# Altium footprint library Airscout_PCB_LibV2.0.PcbLib: 50 footprints (part 3 of 4)
Each footprint in its own frame and in the unit in brackets; x right, y up, seen from the top. Pads: shape width x height; smd on the part's side, far side on the other; paste and mask are expansions set on the pad; w line width, h text height; cw(c..) or ccw(c..) is an arc to the next point about the centre after c.
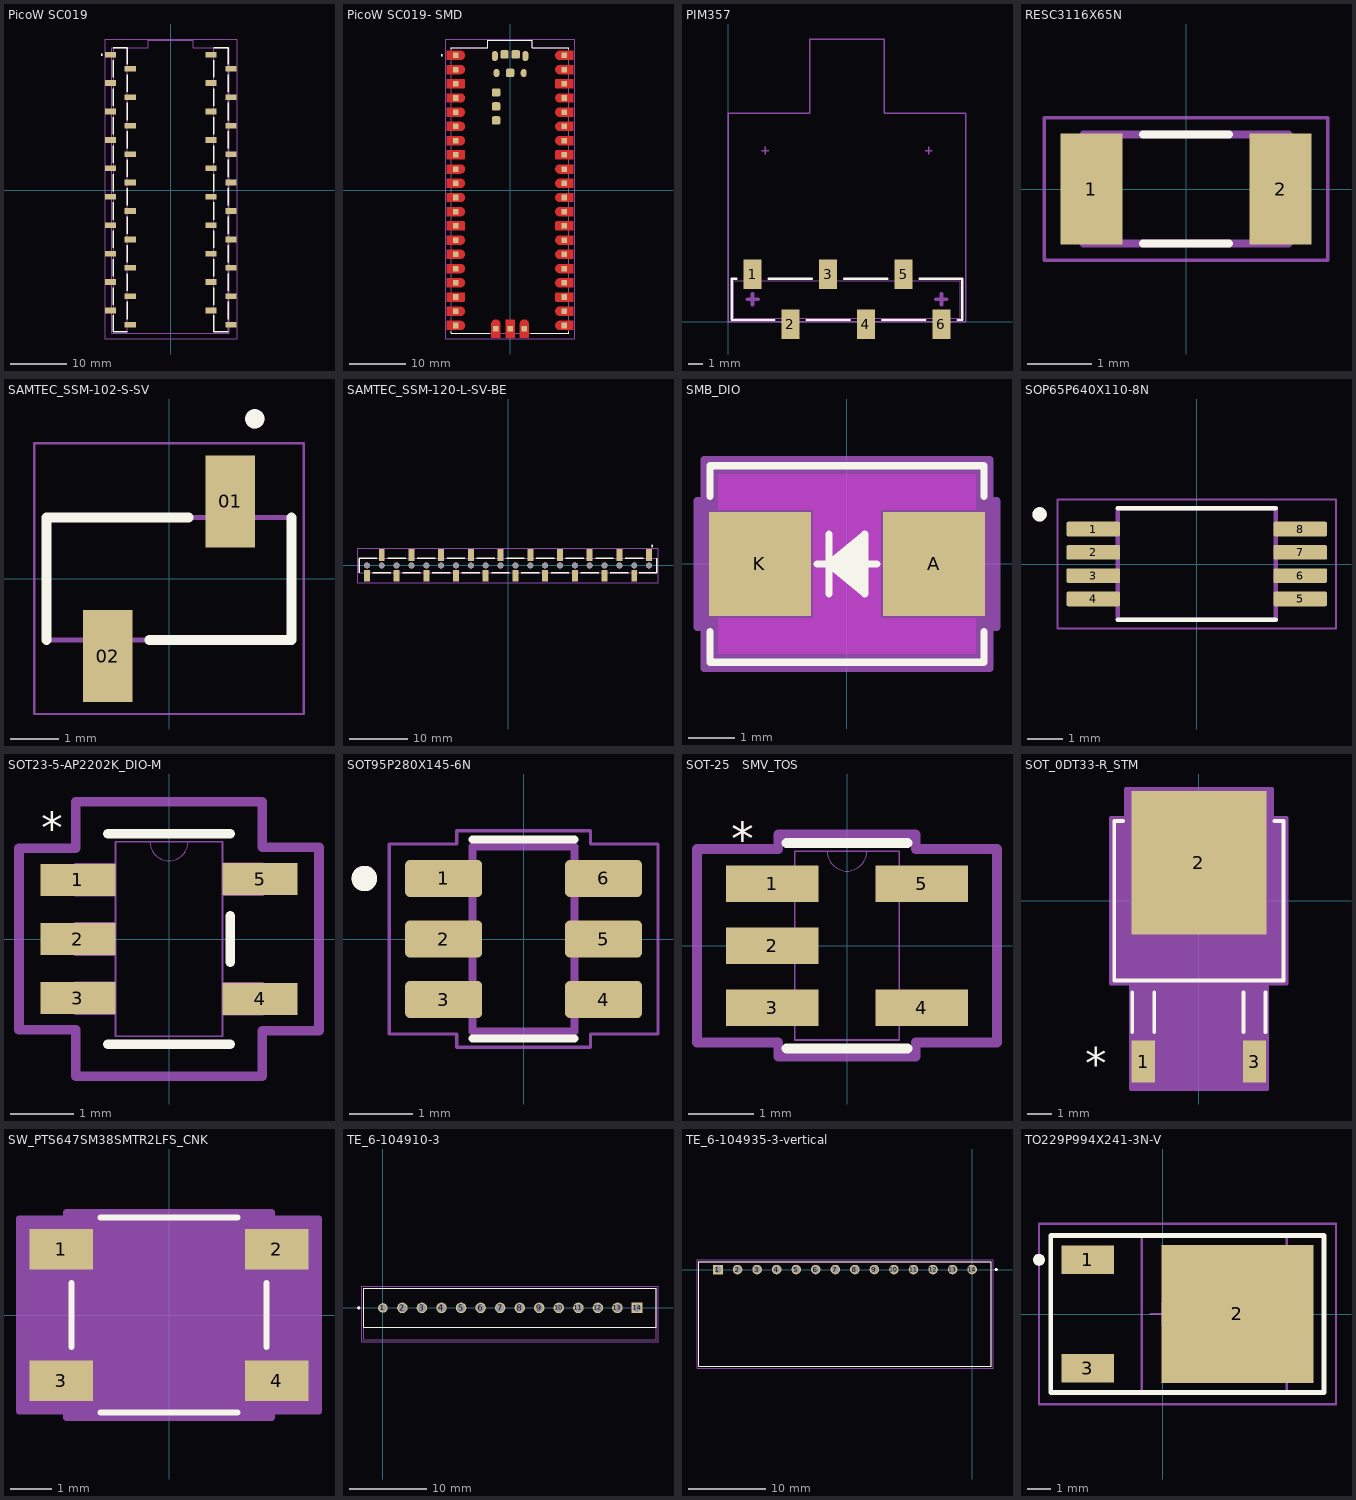
[diagram p2: the footprints below, top view; thin cyan lines are the x and y axes]

## PicoW SC019 [mm] "For Description look into Schematics"
pads (40):
  rect 2x1.02 smd: 1(-10.778,24.26) 2(-7.222,21.72) 3(-10.778,19.18) 4(-7.222,16.64) 5(-10.778,14.1) 6(-7.222,11.56) 7(-10.778,9.02) 8(-7.222,6.48) 9(-10.778,3.94) 10(-7.222,1.4) 11(-10.778,-1.14) 12(-7.222,-3.68) 13(-10.778,-6.22) 14(-7.222,-8.76) 15(-10.778,-11.3) 16(-7.222,-13.84) 17(-10.778,-16.38) 18(-7.222,-18.92) 19(-10.778,-21.46) 20(-7.222,-24) 21(10.778,-24) 22(7.222,-21.46) 23(10.778,-18.92) 24(7.222,-16.38) 25(10.778,-13.84) 26(7.222,-11.3) 27(10.778,-8.76) 28(7.222,-6.22) 29(10.778,-3.68) 30(7.222,-1.14) 31(10.778,1.4) 32(7.222,3.94) 33(10.778,6.48) 34(7.222,9.02) 35(10.778,11.56) 36(7.222,14.1) 37(10.778,16.64) 38(7.222,19.18) 39(10.778,21.72) 40(7.222,24.26)
Top Overlay:
  circle w0.2: c-12.3,24.26 r0.1
  lines w0.254: -10.27,-22.32 -10.27,-25.27 -7.73,-25.27 ; -10.27,-20.444 -10.27,-17.396 ; -10.27,-15.364 -10.27,-12.316 ; -10.27,-10.284 -10.27,-7.236 ; -10.27,-5.204 -10.27,-2.156 ; -10.27,-0.124 -10.27,2.924 ; -10.27,4.956 -10.27,8.004 ; -10.27,10.036 -10.27,13.084 ; -10.27,15.116 -10.27,18.164 ; -10.27,20.196 -10.27,23.244 ; -10.27,25.53 -7.73,25.53 -7.73,22.58 ; -7.73,-22.984 -7.73,-19.936 ; -7.73,-17.904 -7.73,-14.856 ; -7.73,-12.824 -7.73,-9.776 ; -7.73,-7.744 -7.73,-4.696 ; -7.73,-2.664 -7.73,0.384 ; -7.73,2.416 -7.73,5.464 ; -7.73,7.496 -7.73,10.544 ; -7.73,12.576 -7.73,15.624 ; -7.73,17.656 -7.73,20.704 ; 7.73,-22.32 7.73,-25.27 10.27,-25.27 ; 7.73,-20.444 7.73,-17.396 ; 7.73,-15.364 7.73,-12.316 ; 7.73,-10.284 7.73,-7.236 ; 7.73,-5.204 7.73,-2.156 ; 7.73,-0.124 7.73,2.924 ; 7.73,4.956 7.73,8.004 ; 7.73,10.036 7.73,13.084 ; 7.73,15.116 7.73,18.164 ; 7.73,20.196 7.73,23.244 ; 7.73,25.53 10.27,25.53 10.27,22.58 ; 10.27,-22.984 10.27,-19.936 ; 10.27,-17.904 10.27,-14.856 ; 10.27,-12.824 10.27,-9.776 ; 10.27,-7.744 10.27,-4.696 ; 10.27,-2.664 10.27,0.384 ; 10.27,2.416 10.27,5.464 ; 10.27,7.496 10.27,10.544 ; 10.27,12.576 10.27,15.624 ; 10.27,17.656 10.27,20.704
Mechanical 13:
  circle w0.2: c-12.3,24.26 r0.1
  lines w0.1: -10.27,-25.27 -10.27,25.53 ; -7.73,-25.27 -7.73,25.53 ; 7.73,-25.27 7.73,25.53 ; 10.27,-25.27 10.27,25.53
  lines w0.127: -10.5,-25.5 -10.5,25.5 -4,25.5 -4,26.8 4,26.8 4,25.5 10.5,25.5 10.5,-25.5 -10.5,-25.5
Mechanical 15:
  lines w0.05: -11.8,-26.55 -11.8,27.05 11.8,27.05 11.8,-26.55 -11.8,-26.55
3D body "SSM-120-L-SV-BE-K-TR.stp": height 7.52, standoff -0.1, extent 6.587,-25.27 11.159,25.53
3D body "SSM-120-L-SV-BE-K-TR.stp": height 7.52, standoff -0.1, extent -11.413,-25.27 -6.841,25.53
3D body "step_temp.STEP": height 11.23, standoff 7.5, extent -10.5,-25.5 10.5,26.8

## PicoW SC019- SMD [mm] "For Description look into Schematics"
pads (53):
  rect 1x1 smd paste-1 mask+0: 1(-9.69,24.13) 2(-9.69,21.59) 3(-9.69,19.05) 4(-9.69,16.51) 5(-9.69,13.97) 6(-9.69,11.43) 7(-9.69,8.89) 8(-9.69,6.35) 9(-9.69,3.81) 10(-9.69,1.27) 11(-9.69,-1.27) 12(-9.69,-3.81) 13(-9.69,-6.35) 14(-9.69,-8.89) 15(-9.69,-11.43) 16(-9.69,-13.97) 17(-9.69,-16.51) 18(-9.69,-19.05) 19(-9.69,-21.59) 20(-9.69,-24.13) 21(9.69,-24.13) 22(9.69,-21.59) 23(9.69,-19.05) 24(9.69,-16.51) 25(9.69,-13.97) 26(9.69,-11.43) 27(9.69,-8.89) 28(9.69,-6.35) 29(9.69,-3.81) 30(9.69,-1.27) 31(9.69,1.27) 32(9.69,3.81) 33(9.69,6.35) 34(9.69,8.89) 35(9.69,11.43) 36(9.69,13.97) 37(9.69,16.51) 38(9.69,19.05) 39(9.69,21.59) 40(9.69,24.13) D1(-2.54,-24.7) D2(0,-24.7) D3(2.54,-24.7)
  oval 1.1x1.8 smd: A(-2.725,24) B(2.725,24)
  oval 1.05x1.45 smd: C(-2.425,20.97) D(2.425,20.97)
  rrect40% 1.5x1.5 smd: TP1(0,21) TP2(1,24.3) TP3(-1,24.3) TP4(-2.5,17.5) TP5(-2.5,15) TP6(-2.5,12.5)
Top Layer:
  drawing of 43 lines, arcs and shapes, not listed
Top Overlay:
  circle w0.2: c-12.19,24.13 r0.1
  lines w0.127: -10.5,-25.25 -10.5,-25.5 -3.66,-25.5 ; -10.5,25.25 -10.5,25.5 -4,25.5 -4,26.8 4,26.8 4,25.5 10.5,25.5 10.5,25.25 ; 3.66,-25.5 10.5,-25.5 10.5,-25.25
Top Paste:
  drawing of 43 lines, arcs and shapes, not listed
Top Solder:
  drawing of 43 lines, arcs and shapes, not listed
Mechanical 13:
  circle w0.2: c-12.19,24.13 r0.1
  lines w0.127: -10.5,-25.5 -10.5,25.5 -4,25.5 -4,26.8 4,26.8 4,25.5 10.5,25.5 10.5,-25.5 -10.5,-25.5
Mechanical 15:
  lines w0.05: -11.54,-26.55 -11.54,27.05 11.54,27.05 11.54,-26.55 -11.54,-26.55
3D body "step_temp.STEP": height 6.27, standoff 2.54, extent -10.5,-25.5 10.5,26.8

## PIM357 [mm] "With BME680 Sensor"
pads (6):
  rect 1.2x2 smd paste+0 mask+0.025: 1(1.65,3.176) 2(4.19,-0.176) 3(6.73,3.176) 4(9.27,-0.176) 5(11.81,3.176) 6(14.35,-0.176)
Top Overlay:
  lines w0.152: 0.568,2.872 0.253,2.872 0.253,0.103 3.108,0.103 ; 2.732,2.872 5.648,2.872 ; 5.272,0.103 8.188,0.103 ; 7.812,2.872 10.728,2.872 ; 10.352,0.103 13.268,0.103 ; 12.892,2.872 15.747,2.872 15.747,0.103 15.432,0.103
Mechanical 7:
  lines w0.254: 1.285,1.5 2.015,1.5 ; 1.65,1.135 1.65,1.865 ; 13.985,1.5 14.715,1.5 ; 14.35,1.135 14.35,1.865
Mechanical 13:
  lines w0.025: 0.38,0.23 0.38,2.745 15.62,2.745 15.62,0.23 0.38,0.23
  lines w0.1: 0,1.5 0,0 ; 2.25,11.5 2.75,11.5 ; 2.5,11.25 2.5,11.75 ; 13.25,11.5 13.75,11.5 ; 13.5,11.25 13.5,11.75 ; 16,11.5 16,14 ; 0,0 16,0 16,14 ; 0,0 0,14 5.5,14 5.5,19 10.5,19 10.5,14 16,14
3D body "NPPC061KFXC-RC--3DModel-STEP-740413.STEP": height 7.49, standoff 0, extent 0.381,-0.749 15.621,3.543

## RESC3116X65N [mm] "Caseform: 1206 Imperial"
pads (2):
  rect 0.97x1.73 smd: 1(-1.48,0) 2(1.48,0)
Top Overlay:
  lines w0.127: -0.67,-0.85 0.67,-0.85 ; -0.67,0.85 0.67,0.85
Mechanical 13:
  lines w0.127: -1.6,-0.85 1.6,-0.85 1.6,0.85 -1.6,0.85 -1.6,-0.85
Mechanical 15:
  lines w0.05: -2.215,-1.115 2.215,-1.115 2.215,1.115 -2.215,1.115 -2.215,-1.115
3D body "step_temp.STEP": height 0.65, standoff 0, extent -1.55,-0.8 1.55,0.8

## SAMTEC_SSM-102-S-SV [mm]
pads (2):
  rect 1.02x1.905 smd: 01(1.27,1.603) 02(-1.27,-1.603)
Top Overlay:
  circle w0.2: c1.78,3.315 r0.1
  lines w0.2: -2.54,-1.27 -2.54,1.27 0.41,1.27 ; -0.41,-1.27 2.54,-1.27 2.54,1.27
Mechanical 13:
  circle w0.2: c1.78,3.315 r0.1
  lines w0.1: -2.54,-1.27 -2.54,1.27 2.54,1.27 2.54,-1.27 -2.54,-1.27
Mechanical 15:
  lines w0.05: -2.79,-2.805 -2.79,2.805 2.79,2.805 2.79,-2.805 -2.79,-2.805
3D body "SSM-102-S-SV.stp": height 7.37, standoff -0.13, extent -2.54,-2.286 2.54,2.286

## SAMTEC_SSM-120-L-SV-BE [mm]
pads (40):
  rect 1.02x2 smd: 01(24.13,1.778) 02(21.59,-1.778) 03(19.05,1.778) 04(16.51,-1.778) 05(13.97,1.778) 06(11.43,-1.778) 07(8.89,1.778) 08(6.35,-1.778) 09(3.81,1.778) 10(1.27,-1.778) 11(-1.27,1.778) 12(-3.81,-1.778) 13(-6.35,1.778) 14(-8.89,-1.778) 15(-11.43,1.778) 16(-13.97,-1.778) 17(-16.51,1.778) 18(-19.05,-1.778) 19(-21.59,1.778) 20(-24.13,-1.778)
  round 1.02 hole 1.02 unplated: ""(-24.13,0) ""(-21.59,0) ""(-19.05,0) ""(-16.51,0) ""(-13.97,0) ""(-11.43,0) ""(-8.89,0) ""(-6.35,0) ""(-3.81,0) ""(-1.27,0) ""(1.27,0) ""(3.81,0) ""(6.35,0) ""(8.89,0) ""(11.43,0) ""(13.97,0) ""(16.51,0) ""(19.05,0) ""(21.59,0) ""(24.13,0)
Top Overlay:
  circle w0.2: c24.64,3.315 r0.1
  lines w0.254: -25.4,-1.27 -25.4,1.27 -22.45,1.27 ; -23.114,-1.27 -20.066,-1.27 ; -20.574,1.27 -17.526,1.27 ; -18.034,-1.27 -14.986,-1.27 ; -15.494,1.27 -12.446,1.27 ; -12.954,-1.27 -9.906,-1.27 ; -10.414,1.27 -7.366,1.27 ; -7.874,-1.27 -4.826,-1.27 ; -5.334,1.27 -2.286,1.27 ; -2.794,-1.27 0.254,-1.27 ; -0.254,1.27 2.794,1.27 ; 2.286,-1.27 5.334,-1.27 ; 4.826,1.27 7.874,1.27 ; 7.366,-1.27 10.414,-1.27 ; 9.906,1.27 12.954,1.27 ; 12.446,-1.27 15.494,-1.27 ; 14.986,1.27 18.034,1.27 ; 17.526,-1.27 20.574,-1.27 ; 20.066,1.27 23.114,1.27 ; 22.45,-1.27 25.4,-1.27 25.4,1.27
Mechanical 13:
  circle w0.2: c24.64,3.315 r0.1
  lines w0.1: -25.4,-1.27 25.4,-1.27 25.4,1.27 -25.4,1.27 -25.4,-1.27
Mechanical 15:
  lines w0.05: -25.65,-2.921 25.65,-2.921 25.65,2.921 -25.65,2.921 -25.65,-2.921
3D body "SSM-120-L-SV-BE-K-TR.stp": height 7.52, standoff -0.1, extent -25.4,-2.413 25.4,2.159

## SMB_DIO [mm]
pads (2):
  rect 2.18x2.21 smd paste+0 mask+0: A(1.857,0) K(-1.857,0)
Top Layer keep-out:
  region: -2.744,-1.919 -2.744,-1.156 2.744,-1.156 2.744,-1.919
  region: -2.744,1.156 -2.744,1.919 2.744,1.919 2.744,1.156
  region: -0.716,-1.156 -0.716,1.156 0.716,1.156 0.716,-1.156
Top Overlay:
  lines w0.152: -2.922,-1.438 -2.922,-2.097 2.922,-2.097 2.922,-1.438 ; -2.922,1.438 -2.922,2.097 2.922,2.097 2.922,1.438 ; -0.636,0 0.634,0 ; -0.382,-0.635 -0.382,0.635 ; 0.38,-0.508 -0.382,0 ; 0.38,-0.381 -0.382,0 ; 0.38,-0.254 -0.382,0 ; 0.38,-0.127 -0.382,0 ; 0.38,0.127 -0.382,0 ; 0.38,0.254 -0.382,0 ; 0.38,0.381 -0.382,0 ; 0.38,0.508 -0.382,0 ; -0.382,0 0.38,0.635 0.38,-0.635 -0.382,0
Mechanical 13:
  lines w0.025: -0.636,0 0.634,0 ; -0.382,-0.635 -0.382,0.635 ; 0.38,-0.508 -0.382,0 ; 0.38,-0.381 -0.382,0 ; 0.38,-0.254 -0.382,0 ; 0.38,-0.127 -0.382,0 ; 0.38,0.127 -0.382,0 ; 0.38,0.254 -0.382,0 ; 0.38,0.381 -0.382,0 ; 0.38,0.508 -0.382,0 ; -0.382,0 0.38,0.635 0.38,-0.635 -0.382,0 ; -2.795,-1.97 -2.795,1.97 2.795,1.97 2.795,-1.97 -2.795,-1.97
Mechanical 15:
  region: -3.049,-1.359 -3.201,-1.359 -3.201,1.359 -3.049,1.359 -3.049,2.224 3.049,2.224 3.049,1.359 3.201,1.359 3.201,-1.359 3.049,-1.359 3.049,-2.224 -3.049,-2.224
  lines w0.152: -3.201,-1.359 -3.049,-1.359 -3.049,-2.224 3.049,-2.224 3.049,-1.359 3.201,-1.359 3.201,1.359 3.049,1.359 3.049,2.224 -3.049,2.224 -3.049,1.359 -3.201,1.359 -3.201,-1.359
3D body "SMB_DIO.step": height 2.45, standoff 0, extent -2.795,-1.97 2.795,1.97

## SOP65P640X110-8N [mm]
pads (8):
  rrect25% 1.5x0.41 smd mask+0.065: 1(-2.885,0.975) 2(-2.885,0.325) 3(-2.885,-0.325) 4(-2.885,-0.975) 5(2.885,-0.975) 6(2.885,-0.325) 7(2.885,0.325) 8(2.885,0.975)
Top Overlay:
  circle w0.2: c-4.385,1.385 r0.1
  lines w0.127: -2.2,-1.55 2.2,-1.55 ; -2.2,1.55 2.2,1.55
Mechanical 13:
  circle w0.2: c-4.385,1.385 r0.1
  lines w0.127: -2.2,-1.55 -2.2,1.55 2.2,1.55 2.2,-1.55 -2.2,-1.55
Mechanical 15:
  lines w0.05: -3.885,-1.8 -3.885,1.8 3.885,1.8 3.885,-1.8 -3.885,-1.8
3D body "TSSOP8.STEP": height 1, standoff 0, extent -3.2,-1.5 3.2,1.5

## SOT23-5-AP2202K_DIO-M [mil]
pads (5):
  rect 47.15x20 smd paste+0 mask+0: 1(-57.08,37) 2(-57.08,0) 3(-57.08,-37) 4(57.08,-37.5) 5(57.08,37.5)
Top Overlay:
  lines w6: -38.5,-66 38.5,-66 ; -38.5,66 38.5,66 ; 38.5,-14.4 38.5,14.4
  text "*" at -80,60 h20
Mechanical 13:
  lines w0: -12,61 ccw(c0,61) 12,61
  lines w1: -59,-47 -33.5,-47 -33.5,-27 -59,-27 -59,-47 ; -59,-10 -33.5,-10 -33.5,10 -59,10 -59,-10 ; -59,27 -33.5,27 -33.5,47 -59,47 -59,27 ; -33.5,-61 -33.5,61 33.5,61 33.5,-61 -33.5,-61 ; 33.5,-47.5 59,-47.5 59,-27.5 33.5,-27.5 33.5,-47.5 ; 33.5,27.5 59,27.5 59,47.5 33.5,47.5 33.5,27.5
  text "*" at -80,60 h20
Mechanical 15:
  lines w6: -94,-57 -94,57 -58.5,57 -58.5,86 58.5,86 58.5,57.5 94,57.5 94,-57.5 58.5,-57.5 58.5,-86 -58.5,-86 -58.5,-57 -94,-57
3D body "SOT23-5-AP2202K_DIO.step": height 57.09, standoff 0, extent -59.02,-60.98 59.02,60.98

## SOT95P280X145-6N [mm]
pads (6):
  rrect25% 1.21x0.58 smd: 1(-1.255,0.95) 2(-1.255,0) 3(-1.255,-0.95) 4(1.255,-0.95) 5(1.255,0) 6(1.255,0.95)
Top Overlay:
  circle w0.2: c-2.5,0.95 r0.1
  lines w0.127: -0.8,-1.56 0.8,-1.56 ; -0.8,1.56 0.8,1.56
Mechanical 13:
  circle w0.2: c-2.5,0.95 r0.1
  lines w0.127: -0.8,-1.45 -0.8,1.45 0.8,1.45 0.8,-1.45 -0.8,-1.45
Mechanical 15:
  lines w0.05: -2.11,-1.49 -2.11,1.49 -1.05,1.49 -1.05,1.7 1.05,1.7 1.05,1.49 2.11,1.49 2.11,-1.49 1.05,-1.49 1.05,-1.7 -1.05,-1.7 -1.05,-1.49 -2.11,-1.49
3D body "step_temp.STEP": height 1.45, standoff 0, extent -1.4,-1.45 1.4,1.45

## SOT-25   SMV_TOS [mil]
pads (5):
  rect 56x22 smd paste+0 mask+0: 1(-45.06,37.4) 2(-45.06,0) 3(-45.06,-37.4) 4(45.06,-37.4) 5(45.06,37.4)
Top Overlay:
  lines w6: -36.5,-62 36.5,-62 ; -36.5,62 36.5,62
  text "*" at -70,55 h20
Mechanical 13:
  lines w0: -12,57 ccw(c0,57) 12,57
  lines w1: 31.5,-10 31.5,10 ; -59.06,-47.4 -31.5,-47.4 -31.5,-27.4 -59.06,-27.4 -59.06,-47.4 ; -59.06,-10 -31.5,-10 -31.5,10 -59.06,10 -59.06,-10 ; -59.06,27.4 -31.5,27.4 -31.5,47.4 -59.06,47.4 -59.06,27.4 ; -31.5,-57 -31.5,57 31.5,57 31.5,-57 -31.5,-57 ; 31.5,-47.4 59.06,-47.4 59.06,-27.4 31.5,-27.4 31.5,-47.4 ; 31.5,27.4 59.06,27.4 59.06,47.4 31.5,47.4 31.5,27.4
  text "*" at -70,55 h20
Mechanical 15:
  lines w6: -90.55,-58.4 -41.5,-58.4 -41.5,-67 41.5,-67 41.5,-58.4 90.55,-58.4 90.55,58.4 41.5,58.4 41.5,67 -41.5,67 -41.5,58.4 -90.55,58.4 -90.55,-58.4
3D body "SMV_z90.stp": height 45.28, standoff 0, extent -55.12,-57.09 55.12,57.09

## SOT_0DT33-R_STM [mil]
pads (3):
  rect 37x67 smd paste+0 mask+0: 1(-88.58,-256.5) 3(88.58,-256.5)
  rect 215x229 smd paste+0 mask+0: 2(0,60.5)
Top Overlay:
  lines w6: -120.6,127 -135,127 -135,-127 135,-127 135,127 120.6,127 ; -106.08,-209 -106.08,-146 ; -71.08,-209 -71.08,-146 ; 71.08,-209 71.08,-146 ; 106.08,-209 106.08,-146
  text "*" at -181.1,-283.46 h50
Mechanical 13:
  lines w1: -130,-122 130,-122 130,122 -130,122 -130,-122 ; -106.08,-276 -106.08,-122 -71.08,-122 -71.08,-276 -106.08,-276 ; 71.08,-276 71.08,-122 106.08,-122 106.08,-276 71.08,-276
  text "*" at -181.1,-283.46 h50
Mechanical 15:
  region: -140,-132 -140,132 -116.5,132 -116.5,178 116.5,178 116.5,132 140,132 140,-132 108.58,-132 108.58,-300 -108.58,-300 -108.58,-132
  lines w6: -140,-132 -140,132 -116.5,132 -116.5,178 116.5,178 116.5,132 140,132 140,-132 108.58,-132 108.58,-300 -108.58,-300 -108.58,-132 -140,-132
3D body "SOT_0DT33-R_STM.step": height 94.09, standoff -2.01, extent -130,-275.98 130,154.02

## SW_PTS647SM38SMTR2LFS_CNK [mm]
pads (4):
  rect 1.549x0.991 smd paste+0 mask+0: 1(-2.625,1.6) 2(2.625,1.6) 3(-2.625,-1.6) 4(2.625,-1.6)
Top Overlay:
  lines w0.152: -2.375,-0.772 -2.375,0.772 ; -1.67,-2.375 1.67,-2.375 ; -1.67,2.375 1.67,2.375 ; 2.375,-0.772 2.375,0.772
Mechanical 13:
  lines w0: -0.305,2.248 ccw(c0,2.248) 0.305,2.248
  lines w0.025: -2.248,-2.248 2.248,-2.248 2.248,2.248 -2.248,2.248 -2.248,-2.248
Mechanical 15:
  region: -2.502,-2.349 -3.654,-2.349 -3.654,2.349 -2.502,2.349 -2.502,2.502 2.502,2.502 2.502,2.349 3.654,2.349 3.654,-2.349 2.502,-2.349 2.502,-2.502 -2.502,-2.502
  lines w0.152: -3.654,-2.349 -3.654,2.349 -2.502,2.349 -2.502,2.502 2.502,2.502 2.502,2.349 3.654,2.349 3.654,-2.349 2.502,-2.349 2.502,-2.502 -2.502,-2.502 -2.502,-2.349 -3.654,-2.349
3D body "SW_PTS647SM38SMTR2LFS_CNK.step": height 3.81, standoff 0, extent -3.05,-2.248 3.05,2.248

## TE_6-104910-3 [mm]
pads (14):
  round 1.24 hole 0.89: 1(0,0)
  round 1.37 hole 1.02: 2(2.54,0) 3(5.08,0) 4(7.62,0) 5(10.16,0) 6(12.7,0) 7(15.24,0) 8(17.78,0) 9(20.32,0) 10(22.86,0) 11(25.4,0) 12(27.94,0) 13(30.48,0)
  rect 1.37x1.37 hole 1.02: 14(33.02,0)
Top Overlay:
  circle w0.2: c-3.125,0 r0.1
  lines w0.127: -2.475,-2.54 35.495,-2.54 35.495,2.54 -2.475,2.54 -2.475,-2.54
Mechanical 13:
  circle w0.2: c-3.125,0 r0.1
  lines w0.127: -2.475,-2.54 -2.475,-4.12 35.495,-4.12 35.495,-2.54 ; -2.475,-2.54 35.495,-2.54 ; -2.475,-2.54 -2.475,2.54 35.495,2.54 35.495,-2.54
Mechanical 15:
  lines w0.05: -2.725,-4.37 35.745,-4.37 35.745,2.79 -2.725,2.79 -2.725,-4.37
3D body "705430013.stp": height 11.43, standoff -3.68, extent -2.54,-4.064 35.56,2.54

## TE_6-104935-3-vertical [mm]
pads (14):
  rect 1.24x1.24 hole 0.89: 1(-33.02,0)
  round 1.24 hole 0.89: 2(-30.48,0) 3(-27.94,0) 4(-25.4,0) 5(-22.86,0) 6(-20.32,0) 7(-17.78,0) 8(-15.24,0) 9(-12.7,0) 10(-10.16,0) 11(-7.62,0) 12(-5.08,0) 13(-2.54,0) 14(0,0)
Top Overlay:
  circle w0.2: c3.125,0 r0.1
  lines w0.127: -35.495,-12.57 2.475,-12.57 2.475,1.02 -35.495,1.02 -35.495,-12.57
Mechanical 13:
  circle w0.2: c3.125,0 r0.1
  lines w0.127: -35.495,-12.57 2.475,-12.57 ; -35.495,-12.57 2.475,-12.57 ; -35.495,-12.57 -35.495,1.02 2.475,1.02 2.475,-12.57
Mechanical 15:
  lines w0.05: -35.745,-12.82 2.725,-12.82 2.725,1.27 -35.745,1.27 -35.745,-12.82
3D body "705530013--3DModel-STEP-510211.STEP": height 6.98, standoff -3.3, extent -35.56,-12.763 2.54,0.826

## TO229P994X241-3N-V [mm] "TO,2.29mm pitch;2 pin,9.94mm L X 6.095mm W X 2.41mm H body"
height 2.41
pads (3):
  rect 2.2x1.2 smd paste+0 mask+0: 1(-3.15,2.28) 3(-3.15,-2.28)
  rect 6.4x5.8 smd paste+0 mask+0: 2(3.15,0)
Top Overlay:
  circle w0.25: c-5.2,2.28 r0.125
  lines w0.2: -4.7,-3.3 -4.7,3.3 6.8,3.3 6.8,-3.3 -4.7,-3.3
Mechanical 3:
  text ".DESIGNATOR" at 0,0 h1.2
Mechanical 13:
  lines w0.1: -0.875,-3.282 -0.875,3.282 5.22,3.282 5.22,-3.282 -0.875,-3.282
Mechanical 15:
  lines w0.1: -0.5,0 0.5,0 ; 0,-0.5 0,0.5 ; -5.2,-3.8 7.3,-3.8 7.3,3.8 -5.2,3.8 -5.2,-3.8
3D body "PG-TO252-3-311.stp": height 2.36, standoff 0, extent -3.94,-3.25 6.04,3.25